# Altium footprint library Connector_art.PcbLib: 209 footprints (part 9 of 14)
Each footprint in its own frame and in the unit in brackets; x right, y up, seen from the top. Pads: shape width x height; smd on the part's side, far side on the other; paste and mask are expansions set on the pad; w line width, h text height; cw(c..) or ccw(c..) is an arc to the next point about the centre after c.
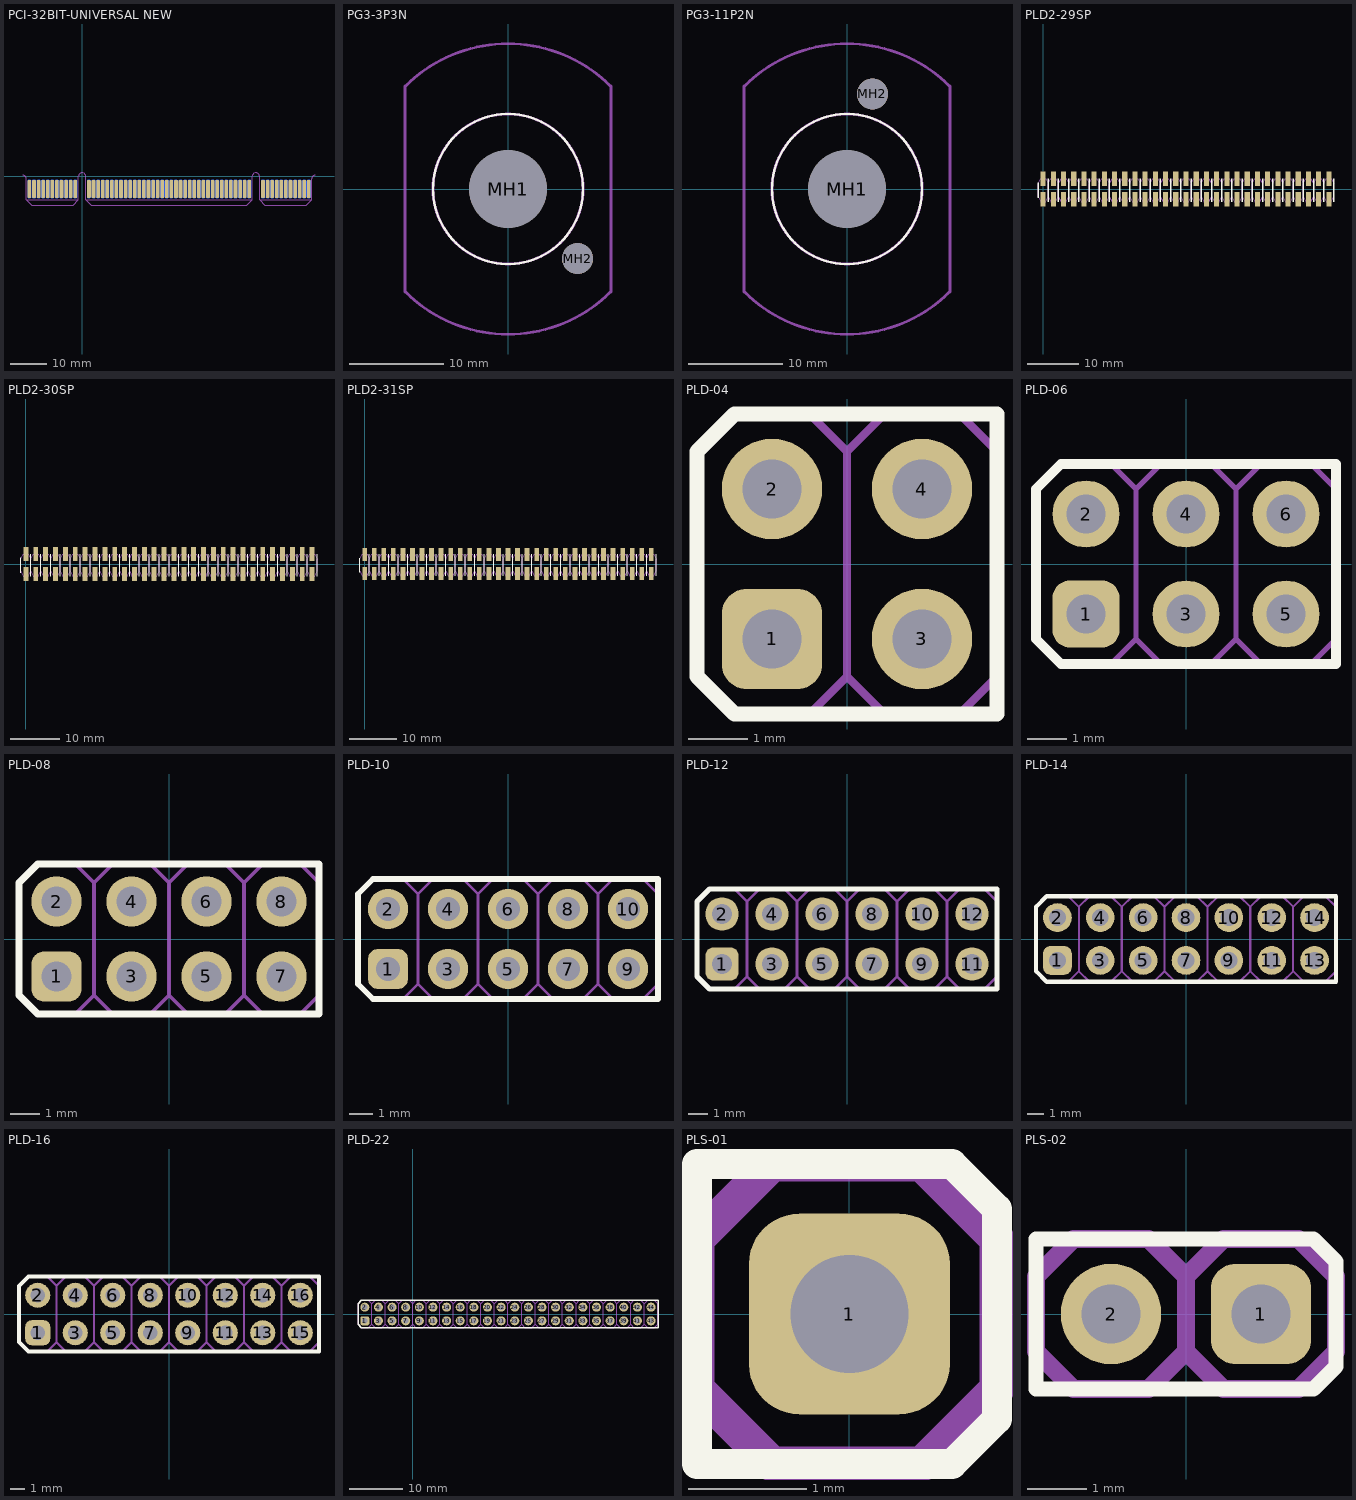
[diagram p8: the footprints below, top view; thin cyan lines are the x and y axes]

## PCI-32BIT-UNIVERSAL NEW [mm]
pads (116):
  rrect50% 1x5 smd far side: A1(-14.61,-3.5) A2(-13.34,-3.5) A3(-12.07,-3.5) A4(-10.8,-3.5) A5(-9.53,-3.5) A6(-8.26,-3.5) A7(-6.99,-3.5) A8(-5.72,-3.5) A9(-4.45,-3.5) A10(-3.18,-3.5) A11(-1.91,-3.5) A14(1.9,-3.5) A15(3.17,-3.5) A16(4.44,-3.5) A17(5.71,-3.5) A18(6.98,-3.5) A19(8.25,-3.5) A20(9.52,-3.5) A21(10.79,-3.5) A22(12.06,-3.5) A23(13.33,-3.5) A24(14.6,-3.5) A25(15.87,-3.5) A26(17.14,-3.5) A27(18.41,-3.5) A28(19.68,-3.5) A29(20.95,-3.5) A30(22.22,-3.5) A31(23.49,-3.5) A32(24.76,-3.5) A33(26.03,-3.5) A34(27.3,-3.5) A35(28.57,-3.5) A36(29.84,-3.5) A37(31.11,-3.5) A38(32.38,-3.5) A39(33.65,-3.5) A40(34.92,-3.5) A41(36.19,-3.5) A42(37.46,-3.5) A43(38.73,-3.5) A44(40,-3.5) A45(41.27,-3.5) A46(42.54,-3.5) A47(43.81,-3.5) A48(45.08,-3.5) A49(46.35,-3.5) A52(50.17,-3.5) A53(51.44,-3.5) A54(52.71,-3.5) A55(53.98,-3.5) A56(55.25,-3.5) A57(56.52,-3.5) A58(57.79,-3.5) A59(59.06,-3.5) A60(60.33,-3.5) A61(61.6,-3.5) A62(62.87,-3.5)
  rrect50% 1x5 smd: B1(-14.61,-3.5) B2(-13.34,-3.5) B3(-12.07,-3.5) B4(-10.8,-3.5) B5(-9.53,-3.5) B6(-8.26,-3.5) B7(-6.99,-3.5) B8(-5.72,-3.5) B9(-4.45,-3.5) B10(-3.18,-3.5) B11(-1.91,-3.5) B14(1.9,-3.5) B15(3.17,-3.5) B16(4.44,-3.5) B17(5.71,-3.5) B18(6.98,-3.5) B19(8.25,-3.5) B20(9.52,-3.5) B21(10.79,-3.5) B22(12.06,-3.5) B23(13.33,-3.5) B24(14.6,-3.5) B25(15.87,-3.5) B26(17.14,-3.5) B27(18.41,-3.5) B28(19.68,-3.5) B29(20.95,-3.5) B30(22.22,-3.5) B31(23.49,-3.5) B32(24.76,-3.5) B33(26.03,-3.5) B34(27.3,-3.5) B35(28.57,-3.5) B36(29.84,-3.5) B37(31.11,-3.5) B38(32.38,-3.5) B39(33.65,-3.5) B40(34.92,-3.5) B41(36.19,-3.5) B42(37.46,-3.5) B43(38.73,-3.5) B44(40,-3.5) B45(41.27,-3.5) B46(42.54,-3.5) B47(43.81,-3.5) B48(45.08,-3.5) B49(46.35,-3.5) B52(50.17,-3.5) B53(51.44,-3.5) B54(52.71,-3.5) B55(53.98,-3.5) B56(55.25,-3.5) B57(56.52,-3.5) B58(57.79,-3.5) B59(59.06,-3.5) B60(60.33,-3.5) B61(61.6,-3.5) B62(62.87,-3.5)
Top Solder:
  region: 49.2,-0.7 49.2,-6.5 50.7,-8 62.2,-8 63.7,-6.5 63.7,-0.7
  region: 1,-0.7 1,-6.5 2.5,-8 45.7,-8 47.2,-6.5 47.2,-0.7
  region: -15.5,-0.7 -15.5,-6.5 -14,-8 -2.5,-8 -1,-6.5 -1,-0.7
Bottom Solder:
  region: 1,-0.7 1,-6.5 2.5,-8 45.7,-8 47.2,-6.5 47.2,-0.7
  region: 49.2,-0.7 49.2,-6.5 50.7,-8 62.2,-8 63.7,-6.5 63.7,-0.7
  region: -15.5,-0.7 -15.5,-6.5 -14,-8 -2.5,-8 -1,-6.5 -1,-0.7
Mechanical 1:
  lines w0.25: -16.5,0.3 cw(c-16.5,-0.7) -15.5,-0.7 -15.5,-6.5 ; 64.7,0.3 ccw(c64.7,-0.7) 63.7,-0.7 63.7,-6.5 ; -15.5,-6.5 -14,-8 -2.5,-8 -1,-6.5 ; -15.5,-6.5 -1,-6.5 ; -1,-6.5 -1,0 cw(c0,0) 1,0 1,-6.5 ; 1,-6.5 47.2,-6.5 ; 1,-6.5 2.5,-8 45.7,-8 47.2,-6.5 ; 47.2,-6.5 47.2,0 cw(c48.2,0) 49.2,0 49.2,-6.5 ; 49.2,-6.5 63.7,-6.5 ; 49.2,-6.5 50.7,-8 62.2,-8 63.7,-6.5
  text "B52" at 50.6,0 h1.5
  text "B49" at 46.8,0 h1.5
  text "B14" at 2.4,0 h1.5
  text "B11" at -1.4,0 h1.5
  text "B1" at -14.1,0 h1.5
  text "B62" at 63.4,0 h1.5
Mechanical 2:
  lines w0.25: -16.5,0.3 cw(c-16.5,-0.7) -15.5,-0.7 -15.5,-6.5 ; 64.7,0.3 ccw(c64.7,-0.7) 63.7,-0.7 63.7,-6.5 ; -15.5,-6.5 -1,-6.5 ; -15.5,-6.5 -14,-8 -2.5,-8 -1,-6.5 ; -1,-6.5 -1,0 cw(c0,0) 1,0 1,-6.5 ; 1,-6.5 47.2,-6.5 ; 1,-6.5 2.5,-8 45.7,-8 47.2,-6.5 ; 47.2,-6.5 47.2,0 cw(c48.2,0) 49.2,0 49.2,-6.5 ; 49.2,-6.5 63.7,-6.5 ; 49.2,-6.5 50.7,-8 62.2,-8 63.7,-6.5
  text "A52" at 49.6,0 h1.5
  text "A49" at 45.8,0 h1.5
  text "A14" at 1.4,0 h1.5
  text "A11" at -2.4,0 h1.5
  text "A1" at -15.1,0 h1.5
  text "A62" at 62.4,0 h1.5

## PG3-3P3N [mm]
pads (2):
  round 8.3 hole 8.3 unplated: MH1(0,0)
  round 3.3 hole 3.3: MH2(7.42,-7.42)
Top Overlay:
  circle w0.25: c0,0 r8
Bottom Overlay:
  lines w0.25: -11.562,-11.06 ccw(c0,0) 11.562,-11.06 ; -11.562,11.06 cw(c0,0) 11.562,11.06 ; -11.5,-11 -11.5,11 ; 11.5,-11 11.5,11
Mechanical 1:
  circle w0.3: c0,0 r8
  lines w0.3: -11,-11 -11,10.96 ; -10.96,-10.96 ccw(c0,0) 10.96,-10.96 ; -10.96,10.96 cw(c0,0) 10.96,10.96 ; 11,-11 11,11
3D body: height 24.5, standoff -25.5, extent -15.36,-15.5 15.36,15.5

## PG3-11P2N [mm]
pads (2):
  round 8.3 hole 8.3 unplated: MH1(0,0)
  round 3.3 hole 3.3: MH2(2.72,10.14)
Top Overlay:
  circle w0.25: c0,0 r8
Bottom Overlay:
  lines w0.25: -11.562,-11.06 ccw(c0,0) 11.562,-11.06 ; -11.562,11.06 cw(c0,0) 11.562,11.06 ; -11.5,-11 -11.5,11 ; 11.5,-11 11.5,11
Mechanical 1:
  circle w0.3: c0,0 r8
  lines w0.3: -11,-11 -11,10.96 ; -10.96,-10.96 ccw(c0,0) 10.96,-10.96 ; -10.96,10.96 cw(c0,0) 10.96,10.96 ; 11,-11 11,11
3D body: height 24.5, standoff -33.5, extent -15.36,-15.5 15.36,15.5

## PLD2-29SP [mm]
height 6.75
pads (58):
  rect 1x2.8 smd: 1(0,-2) 2(0,2) 3(2,-2) 4(2,2) 5(4,-2) 6(4,2) 7(6,-2) 8(6,2) 9(8,-2) 10(8,2) 11(10,-2) 12(10,2) 13(12,-2) 14(12,2) 15(14,-2) 16(14,2) 17(16,-2) 18(16,2) 19(18,-2) 20(18,2) 21(20,-2) 22(20,2) 23(22,-2) 24(22,2) 25(24,-2) 26(24,2) 27(26,-2) 28(26,2) 29(28,-2) 30(28,2) 31(30,-2) 32(30,2) 33(32,-2) 34(32,2) 35(34,-2) 36(34,2) 37(36,-2) 38(36,2) 39(38,-2) 40(38,2) 41(40,-2) 42(40,2) 43(42,-2) 44(42,2) 45(44,-2) 46(44,2) 47(46,-2) 48(46,2) 49(48,-2) 50(48,2) 51(50,-2) 52(50,2) 53(52,-2) 54(52,2) 55(54,-2) 56(54,2) 57(56,-2) 58(56,2)
Top Overlay:
  lines w0.25: -1,-1.75 -1,1.25 ; 1,-2.5 1,2 ; 3,-2.5 3,2 ; 5,-2.5 5,2 ; 7,-2.5 7,2 ; 9,-2.5 9,2 ; 11,-2.5 11,2 ; 13,-2.5 13,2 ; 15,-2.5 15,2 ; 17,-2.5 17,2 ; 19,-2.5 19,2 ; 21,-2.5 21,2 ; 23,-2.5 23,2 ; 25,-2.5 25,2 ; 27,-2.5 27,2 ; 29,-2.5 29,2 ; 31,-2.5 31,2 ; 33,-2.5 33,2 ; 35,-2.5 35,2 ; 37,-2.5 37,2 ; 39,-2.5 39,2 ; 41,-2.5 41,2 ; 43,-2.5 43,2 ; 45,-2.5 45,2 ; 47,-2.5 47,2 ; 49,-2.5 49,2 ; 51,-2.5 51,2 ; 53,-2.5 53,2 ; 55,-2.5 55,2 ; 57,-2.5 57,2
Mechanical 1:
  drawing of 204 lines, arcs and shapes, not listed
3D body: height 6.75, standoff 0, extent -1,-3.21 57,3.21

## PLD2-30SP [mm]
height 6.75
pads (60):
  rect 1x2.8 smd: 1(0,-2) 2(0,2) 3(2,-2) 4(2,2) 5(4,-2) 6(4,2) 7(6,-2) 8(6,2) 9(8,-2) 10(8,2) 11(10,-2) 12(10,2) 13(12,-2) 14(12,2) 15(14,-2) 16(14,2) 17(16,-2) 18(16,2) 19(18,-2) 20(18,2) 21(20,-2) 22(20,2) 23(22,-2) 24(22,2) 25(24,-2) 26(24,2) 27(26,-2) 28(26,2) 29(28,-2) 30(28,2) 31(30,-2) 32(30,2) 33(32,-2) 34(32,2) 35(34,-2) 36(34,2) 37(36,-2) 38(36,2) 39(38,-2) 40(38,2) 41(40,-2) 42(40,2) 43(42,-2) 44(42,2) 45(44,-2) 46(44,2) 47(46,-2) 48(46,2) 49(48,-2) 50(48,2) 51(50,-2) 52(50,2) 53(52,-2) 54(52,2) 55(54,-2) 56(54,2) 57(56,-2) 58(56,2) 59(58,-2) 60(58,2)
Top Overlay:
  lines w0.25: -1,-1.75 -1,1.25 ; 1,-2.5 1,2 ; 3,-2.5 3,2 ; 5,-2.5 5,2 ; 7,-2.5 7,2 ; 9,-2.5 9,2 ; 11,-2.5 11,2 ; 13,-2.5 13,2 ; 15,-2.5 15,2 ; 17,-2.5 17,2 ; 19,-2.5 19,2 ; 21,-2.5 21,2 ; 23,-2.5 23,2 ; 25,-2.5 25,2 ; 27,-2.5 27,2 ; 29,-2.5 29,2 ; 31,-2.5 31,2 ; 33,-2.5 33,2 ; 35,-2.5 35,2 ; 37,-2.5 37,2 ; 39,-2.5 39,2 ; 41,-2.5 41,2 ; 43,-2.5 43,2 ; 45,-2.5 45,2 ; 47,-2.5 47,2 ; 49,-2.5 49,2 ; 51,-2.5 51,2 ; 53,-2.5 53,2 ; 55,-2.5 55,2 ; 57,-2.5 57,2 ; 59,-2.5 59,2
Mechanical 1:
  drawing of 211 lines, arcs and shapes, not listed
3D body: height 6.75, standoff 0, extent -1,-3.21 59,3.21

## PLD2-31SP [mm]
height 6.75
pads (62):
  rect 1x2.8 smd: 1(0,-2) 2(0,2) 3(2,-2) 4(2,2) 5(4,-2) 6(4,2) 7(6,-2) 8(6,2) 9(8,-2) 10(8,2) 11(10,-2) 12(10,2) 13(12,-2) 14(12,2) 15(14,-2) 16(14,2) 17(16,-2) 18(16,2) 19(18,-2) 20(18,2) 21(20,-2) 22(20,2) 23(22,-2) 24(22,2) 25(24,-2) 26(24,2) 27(26,-2) 28(26,2) 29(28,-2) 30(28,2) 31(30,-2) 32(30,2) 33(32,-2) 34(32,2) 35(34,-2) 36(34,2) 37(36,-2) 38(36,2) 39(38,-2) 40(38,2) 41(40,-2) 42(40,2) 43(42,-2) 44(42,2) 45(44,-2) 46(44,2) 47(46,-2) 48(46,2) 49(48,-2) 50(48,2) 51(50,-2) 52(50,2) 53(52,-2) 54(52,2) 55(54,-2) 56(54,2) 57(56,-2) 58(56,2) 59(58,-2) 60(58,2) 61(60,-2) 62(60,2)
Top Overlay:
  lines w0.25: -1,-1.75 -1,1.25 ; 1,-2.5 1,2 ; 3,-2.5 3,2 ; 5,-2.5 5,2 ; 7,-2.5 7,2 ; 9,-2.5 9,2 ; 11,-2.5 11,2 ; 13,-2.5 13,2 ; 15,-2.5 15,2 ; 17,-2.5 17,2 ; 19,-2.5 19,2 ; 21,-2.5 21,2 ; 23,-2.5 23,2 ; 25,-2.5 25,2 ; 27,-2.5 27,2 ; 29,-2.5 29,2 ; 31,-2.5 31,2 ; 33,-2.5 33,2 ; 35,-2.5 35,2 ; 37,-2.5 37,2 ; 39,-2.5 39,2 ; 41,-2.5 41,2 ; 43,-2.5 43,2 ; 45,-2.5 45,2 ; 47,-2.5 47,2 ; 49,-2.5 49,2 ; 51,-2.5 51,2 ; 53,-2.5 53,2 ; 55,-2.5 55,2 ; 57,-2.5 57,2 ; 59,-2.5 59,2 ; 61,-2.5 61,2
Mechanical 1:
  drawing of 218 lines, arcs and shapes, not listed
3D body: height 6.75, standoff 0, extent -1,-3.21 61,3.21

## PLD-04 [mm]
pads (4):
  rrect50% 1.7x1.7 hole 1: 1(-1.27,-1.27)
  round 1.7 hole 1: 2(-1.27,1.27) 3(1.27,-1.27) 4(1.27,1.27)
Top Overlay:
  lines w0.25: -2.54,-1.905 -2.54,1.905 -1.905,2.54 2.54,2.54 2.54,-2.54 -1.905,-2.54 -2.54,-1.905
Mechanical 1:
  lines w0.13: 0,-1.905 0.635,-2.54 1.905,-2.54 2.54,-1.905 2.54,1.905 1.905,2.54 0.635,2.54 0,1.905 ; 0,-1.905 -0.635,-2.54 -1.905,-2.54 -2.54,-1.905 -2.54,1.905 -1.905,2.54 -0.635,2.54 0,1.905 ; 0,-1.905 0,1.905
3D body: height 8.54, standoff -3, extent -2.54,-2.54 2.54,2.54

## PLD-06 [mm]
pads (6):
  rrect50% 1.7x1.7 hole 1: 1(-2.54,-1.27)
  round 1.7 hole 1: 2(-2.54,1.27) 3(0,-1.27) 4(0,1.27) 5(2.54,-1.27) 6(2.54,1.27)
Top Overlay:
  lines w0.25: -3.81,-1.905 -3.81,1.905 -3.175,2.54 3.81,2.54 3.81,-2.54 -3.175,-2.54 -3.81,-1.905
Mechanical 1:
  lines w0.13: -1.27,-1.905 -0.635,-2.54 0.635,-2.54 1.27,-1.905 ; -1.27,-1.905 -1.905,-2.54 -3.175,-2.54 -3.81,-1.905 -3.81,1.905 -3.175,2.54 -1.905,2.54 -1.27,1.905 ; -1.27,-1.905 -1.27,1.905 ; -1.27,1.905 -0.635,2.54 0.635,2.54 1.27,1.905 ; 1.27,-1.905 1.905,-2.54 3.175,-2.54 3.81,-1.905 3.81,1.905 3.175,2.54 1.905,2.54 1.27,1.905 ; 1.27,-1.905 1.27,1.905
3D body: height 8.54, standoff -3, extent -3.81,-2.54 3.81,2.54

## PLD-08 [mm]
pads (8):
  rrect50% 1.7x1.7 hole 1: 1(-3.81,-1.27)
  round 1.7 hole 1: 2(-3.81,1.27) 3(-1.27,-1.27) 4(-1.27,1.27) 5(1.27,-1.27) 6(1.27,1.27) 7(3.81,-1.27) 8(3.81,1.27)
Top Overlay:
  lines w0.25: -5.08,-1.905 -4.445,-2.54 5.08,-2.54 5.08,2.54 -4.445,2.54 -5.08,1.905 -5.08,-1.905
Mechanical 1:
  lines w0.13: -2.54,-1.905 -2.54,1.905 ; -2.54,-1.905 -3.175,-2.54 -4.445,-2.54 -5.08,-1.905 -5.08,1.905 -4.445,2.54 -3.175,2.54 -2.54,1.905 ; -2.54,-1.905 -1.905,-2.54 -0.635,-2.54 0,-1.905 ; -2.54,1.905 -1.905,2.54 -0.635,2.54 0,1.905 ; 0,-1.905 0,1.905 ; 0,-1.905 0.635,-2.54 1.905,-2.54 2.54,-1.905 ; 0,1.905 0.635,2.54 1.905,2.54 2.54,1.905 ; 2.54,-1.905 3.175,-2.54 4.445,-2.54 5.08,-1.905 5.08,1.905 4.445,2.54 3.175,2.54 2.54,1.905 ; 2.54,-1.905 2.54,1.905
3D body: height 8.54, standoff -3, extent -5.08,-2.54 5.08,2.54

## PLD-10 [mm]
pads (10):
  rrect50% 1.7x1.7 hole 1: 1(-5.08,-1.27)
  round 1.7 hole 1: 2(-5.08,1.27) 3(-2.54,-1.27) 4(-2.54,1.27) 5(0,-1.27) 6(0,1.27) 7(2.54,-1.27) 8(2.54,1.27) 9(5.08,-1.27) 10(5.08,1.27)
Top Overlay:
  lines w0.25: -6.35,-1.905 -6.35,1.905 -5.715,2.54 6.35,2.54 6.35,-2.54 -5.715,-2.54 -6.35,-1.905
Mechanical 1:
  lines w0.13: -3.81,-1.905 -3.175,-2.54 -1.905,-2.54 -1.27,-1.905 ; -3.81,-1.905 -4.445,-2.54 -5.715,-2.54 -6.35,-1.905 -6.35,1.905 -5.715,2.54 -4.445,2.54 -3.81,1.905 ; -3.81,-1.905 -3.81,1.905 ; -3.81,1.905 -3.175,2.54 -1.905,2.54 -1.27,1.905 ; -1.27,-1.905 -0.635,-2.54 0.635,-2.54 1.27,-1.905 ; -1.27,-1.905 -1.27,1.905 ; -1.27,1.905 -0.635,2.54 0.635,2.54 1.27,1.905 ; 1.27,-1.905 1.27,1.905 ; 1.27,-1.905 1.905,-2.54 3.175,-2.54 3.81,-1.905 ; 1.27,1.905 1.905,2.54 3.175,2.54 3.81,1.905 ; 3.81,-1.905 3.81,1.905 ; 3.81,-1.905 4.445,-2.54 5.715,-2.54 6.35,-1.905 6.35,1.905 5.715,2.54 4.445,2.54 3.81,1.905
3D body: height 8.54, standoff -3, extent -6.35,-2.54 6.35,2.54

## PLD-12 [mm]
pads (12):
  rrect50% 1.7x1.7 hole 1: 1(-6.35,-1.27)
  round 1.7 hole 1: 2(-6.35,1.27) 3(-3.81,-1.27) 4(-3.81,1.27) 5(-1.27,-1.27) 6(-1.27,1.27) 7(1.27,-1.27) 8(1.27,1.27) 9(3.81,-1.27) 10(3.81,1.27) 11(6.35,-1.27) 12(6.35,1.27)
Top Overlay:
  lines w0.25: -7.62,-1.905 -7.62,1.905 -6.985,2.54 7.62,2.54 7.62,-2.54 -6.985,-2.54 -7.62,-1.905
Mechanical 1:
  lines w0.13: -5.08,-1.905 -4.445,-2.54 -3.175,-2.54 -2.54,-1.905 ; -5.08,-1.905 -5.715,-2.54 -6.985,-2.54 -7.62,-1.905 -7.62,1.905 -6.985,2.54 -5.715,2.54 -5.08,1.905 ; -5.08,-1.905 -5.08,1.905 ; -5.08,1.905 -4.445,2.54 -3.175,2.54 -2.54,1.905 ; -2.54,-1.905 -1.905,-2.54 -0.635,-2.54 0,-1.905 ; -2.54,-1.905 -2.54,1.905 ; -2.54,1.905 -1.905,2.54 -0.635,2.54 0,1.905 ; 0,-1.905 0,1.905 ; 0,-1.905 0.635,-2.54 1.905,-2.54 2.54,-1.905 ; 0,1.905 0.635,2.54 1.905,2.54 2.54,1.905 ; 2.54,-1.905 2.54,1.905 ; 2.54,-1.905 3.175,-2.54 4.445,-2.54 5.08,-1.905 ; 2.54,1.905 3.175,2.54 4.445,2.54 5.08,1.905 ; 5.08,-1.905 5.08,1.905 ; 5.08,-1.905 5.715,-2.54 6.985,-2.54 7.62,-1.905 7.62,1.905 6.985,2.54 5.715,2.54 5.08,1.905
3D body: height 8.54, standoff -3, extent -7.62,-2.54 7.62,2.54

## PLD-14 [mm]
pads (14):
  rrect50% 1.7x1.7 hole 1: 1(-7.62,-1.27)
  round 1.7 hole 1: 2(-7.62,1.27) 3(-5.08,-1.27) 4(-5.08,1.27) 5(-2.54,-1.27) 6(-2.54,1.27) 7(0,-1.27) 8(0,1.27) 9(2.54,-1.27) 10(2.54,1.27) 11(5.08,-1.27) 12(5.08,1.27) 13(7.62,-1.27) 14(7.62,1.27)
Top Overlay:
  lines w0.25: -8.89,-1.905 -8.255,-2.54 8.89,-2.54 8.89,2.54 -8.255,2.54 -8.89,1.905 -8.89,-1.905
Mechanical 1:
  lines w0.13: -6.35,-1.905 -6.35,1.905 ; -6.35,-1.905 -6.985,-2.54 -8.255,-2.54 -8.89,-1.905 -8.89,1.905 -8.255,2.54 -6.985,2.54 -6.35,1.905 ; -6.35,-1.905 -5.715,-2.54 -4.445,-2.54 -3.81,-1.905 ; -6.35,1.905 -5.715,2.54 -4.445,2.54 -3.81,1.905 ; -3.81,-1.905 -3.81,1.905 ; -3.81,-1.905 -3.175,-2.54 -1.905,-2.54 -1.27,-1.905 ; -3.81,1.905 -3.175,2.54 -1.905,2.54 -1.27,1.905 ; -1.27,-1.905 -0.635,-2.54 0.635,-2.54 1.27,-1.905 ; -1.27,-1.905 -1.27,1.905 ; -1.27,1.905 -0.635,2.54 0.635,2.54 1.27,1.905 ; 1.27,-1.905 1.905,-2.54 3.175,-2.54 3.81,-1.905 ; 1.27,-1.905 1.27,1.905 ; 1.27,1.905 1.905,2.54 3.175,2.54 3.81,1.905 ; 3.81,-1.905 4.445,-2.54 5.715,-2.54 6.35,-1.905 ; 3.81,-1.905 3.81,1.905 ; 3.81,1.905 4.445,2.54 5.715,2.54 6.35,1.905 ; 6.35,-1.905 6.985,-2.54 8.255,-2.54 8.89,-1.905 8.89,1.905 8.255,2.54 6.985,2.54 6.35,1.905 ; 6.35,-1.905 6.35,1.905
3D body: height 8.54, standoff -3, extent -8.89,-2.54 8.89,2.54

## PLD-16 [mm]
pads (16):
  rrect50% 1.7x1.7 hole 1: 1(-8.89,-1.27)
  round 1.7 hole 1: 2(-8.89,1.27) 3(-6.35,-1.27) 4(-6.35,1.27) 5(-3.81,-1.27) 6(-3.81,1.27) 7(-1.27,-1.27) 8(-1.27,1.27) 9(1.27,-1.27) 10(1.27,1.27) 11(3.81,-1.27) 12(3.81,1.27) 13(6.35,-1.27) 14(6.35,1.27) 15(8.89,-1.27) 16(8.89,1.27)
Top Overlay:
  lines w0.25: -10.16,-1.905 -9.525,-2.54 10.16,-2.54 10.16,0 10.16,2.54 -9.525,2.54 -10.16,1.905 -10.16,-1.905
Mechanical 1:
  lines w0.13: -7.62,-1.905 -7.62,1.905 ; -7.62,-1.905 -8.255,-2.54 -9.525,-2.54 -10.16,-1.905 -10.16,1.905 -9.525,2.54 -8.255,2.54 -7.62,1.905 ; -7.62,-1.905 -6.985,-2.54 -5.715,-2.54 -5.08,-1.905 ; -7.62,1.905 -6.985,2.54 -5.715,2.54 -5.08,1.905 ; -5.08,-1.905 -5.08,1.905 ; -5.08,-1.905 -4.445,-2.54 -3.175,-2.54 -2.54,-1.905 ; -5.08,1.905 -4.445,2.54 -3.175,2.54 -2.54,1.905 ; -2.54,-1.905 -1.905,-2.54 -0.635,-2.54 0,-1.905 ; -2.54,-1.905 -2.54,1.905 ; -2.54,1.905 -1.905,2.54 -0.635,2.54 0,1.905 ; 0,-1.905 0.635,-2.54 1.905,-2.54 2.54,-1.905 ; 0,-1.905 0,1.905 ; 0,1.905 0.635,2.54 1.905,2.54 2.54,1.905 ; 2.54,-1.905 3.175,-2.54 4.445,-2.54 5.08,-1.905 ; 2.54,-1.905 2.54,1.905 ; 2.54,1.905 3.175,2.54 4.445,2.54 5.08,1.905 ; 5.08,-1.905 5.715,-2.54 6.985,-2.54 7.62,-1.905 ; 5.08,-1.905 5.08,1.905 ; 5.08,1.905 5.715,2.54 6.985,2.54 7.62,1.905 ; 7.62,-1.905 7.62,1.905 ; 7.62,-1.905 8.255,-2.54 9.525,-2.54 10.16,-1.905 10.16,1.905 9.525,2.54 8.255,2.54 7.62,1.905
3D body: height 8.54, standoff -3, extent -10.16,-2.54 10.16,2.54

## PLD-22 [mm]
pads (44):
  rrect50% 1.7x1.7 hole 1: 1(-8.89,-1.27)
  round 1.7 hole 1: 2(-8.89,1.27) 3(-6.35,-1.27) 4(-6.35,1.27) 5(-3.81,-1.27) 6(-3.81,1.27) 7(-1.27,-1.27) 8(-1.27,1.27) 9(1.27,-1.27) 10(1.27,1.27) 11(3.81,-1.27) 12(3.81,1.27) 13(6.35,-1.27) 14(6.35,1.27) 15(8.89,-1.27) 16(8.89,1.27) 17(11.43,-1.27) 18(11.43,1.27) 19(13.97,-1.27) 20(13.97,1.27) 21(16.51,-1.27) 22(16.51,1.27) 23(19.05,-1.27) 24(19.05,1.27) 25(21.59,-1.27) 26(21.59,1.27) 27(24.13,-1.27) 28(24.13,1.27) 29(26.67,-1.27) 30(26.67,1.27) 31(29.21,-1.27) 32(29.21,1.27) 33(31.75,-1.27) 34(31.75,1.27) 35(34.29,-1.27) 36(34.29,1.27) 37(36.83,-1.27) 38(36.83,1.27) 39(39.37,-1.27) 40(39.37,1.27) 41(41.91,-1.27) 42(41.91,1.27) 43(44.45,-1.27) 44(44.45,1.27)
Top Overlay:
  lines w0.25: -10.16,-1.905 -9.525,-2.54 45.75,-2.54 45.75,2.54 -9.525,2.54 -10.16,1.905 -10.16,-1.905
Mechanical 1:
  drawing of 155 lines, arcs and shapes, not listed
3D body: height 8.54, standoff -3, extent -10.16,-2.54 45.72,2.54

## PLS-01 [mm]
height 8.58
pads (1):
  rrect50% 1.7x1.7 hole 1 paste+0: 1(0,0)
Top Overlay:
  lines w0.25: -1.29,-1.27 -1.29,1.27 0.869,1.27 1.25,0.889 1.25,-0.889 0.869,-1.27 -1.29,-1.27
Mechanical 1:
  lines w0.3: -1.29,-0.635 -1.29,0.635 -0.655,1.27 0.615,1.27 1.25,0.635 1.25,-0.635 0.615,-1.27 -0.655,-1.27 -1.29,-0.635
3D body: height 8.54, standoff -3, extent -1.29,-1.27 1.25,1.27

## PLS-02 [mm]
height 8.58
pads (2):
  rrect50% 1.7x1.7 hole 1 paste+0: 1(1.27,0)
  round 1.7 hole 1: 2(-1.27,0)
Top Overlay:
  lines w0.25: -2.54,-1.27 2.159,-1.27 2.54,-0.889 2.54,0.889 2.159,1.27 -2.54,1.27 -2.54,-1.27
Mechanical 1:
  lines w0.3: 0,-0.635 -0.635,-1.27 -1.905,-1.27 -2.54,-0.635 -2.54,0.635 -1.905,1.27 -0.635,1.27 0,0.635 ; 0,-0.635 0,0.635 ; 0,-0.635 0.635,-1.27 1.905,-1.27 2.54,-0.635 2.54,0.635 1.905,1.27 0.635,1.27 0,0.635
3D body: height 8.54, standoff -3, extent -2.54,-1.27 2.54,1.27